# Altium footprint library En.PcbLib: 240 footprints (part 8 of 15)
Each footprint in its own frame and in the unit in brackets; x right, y up, seen from the top. Pads: shape width x height; smd on the part's side, far side on the other; paste and mask are expansions set on the pad; w line width, h text height; cw(c..) or ccw(c..) is an arc to the next point about the centre after c.
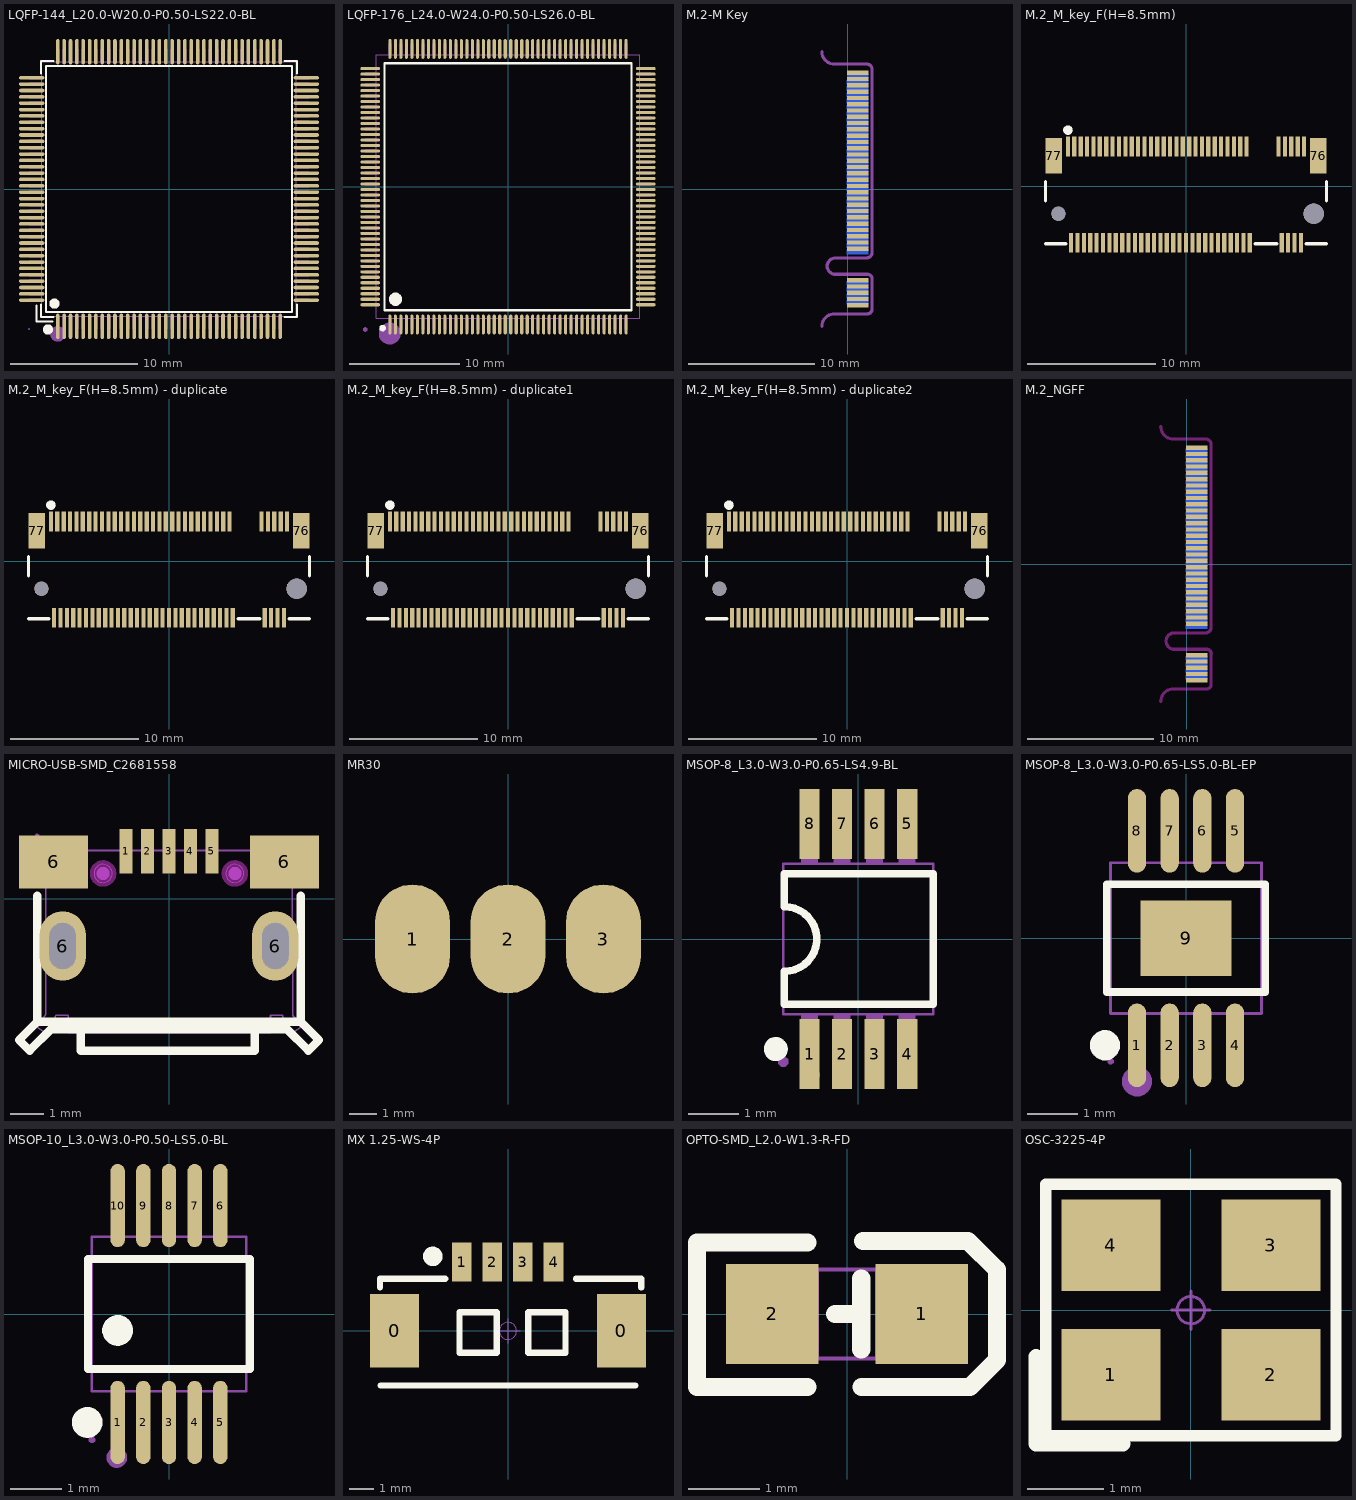
[diagram p7: the footprints below, top view; thin cyan lines are the x and y axes]

## LQFP-144_L20.0-W20.0-P0.50-LS22.0-BL [mm]
pads (144):
  oval 0.28x2 smd: 1(-8.75,-10.8) 2(-8.25,-10.8) 3(-7.75,-10.8) 4(-7.25,-10.8) 5(-6.75,-10.8) 6(-6.25,-10.8) 7(-5.75,-10.8) 8(-5.25,-10.8) 9(-4.75,-10.8) 10(-4.25,-10.8) 11(-3.75,-10.8) 12(-3.25,-10.8) 13(-2.75,-10.8) 14(-2.25,-10.8) 15(-1.75,-10.8) 16(-1.25,-10.8) 17(-0.75,-10.8) 18(-0.25,-10.8) 19(0.25,-10.8) 20(0.75,-10.8) 21(1.25,-10.8) 22(1.75,-10.8) 23(2.25,-10.8) 24(2.75,-10.8) 25(3.25,-10.8) 26(3.75,-10.8) 27(4.25,-10.8) 28(4.75,-10.8) 29(5.25,-10.8) 30(5.75,-10.8) 31(6.25,-10.8) 32(6.75,-10.8) 33(7.25,-10.8) 34(7.75,-10.8) 35(8.25,-10.8) 36(8.75,-10.8) 73(8.75,10.8) 74(8.25,10.8) 75(7.75,10.8) 76(7.25,10.8) 77(6.75,10.8) 78(6.25,10.8) 79(5.75,10.8) 80(5.25,10.8) 81(4.75,10.8) 82(4.25,10.8) 83(3.75,10.8) 84(3.25,10.8) 85(2.75,10.8) 86(2.25,10.8) 87(1.75,10.8) 88(1.25,10.8) 89(0.75,10.8) 90(0.25,10.8) 91(-0.25,10.8) 92(-0.75,10.8) 93(-1.25,10.8) 94(-1.75,10.8) 95(-2.25,10.8) 96(-2.75,10.8) 97(-3.25,10.8) 98(-3.75,10.8) 99(-4.25,10.8) 100(-4.75,10.8) 101(-5.25,10.8) 102(-5.75,10.8) 103(-6.25,10.8) 104(-6.75,10.8) 105(-7.25,10.8) 106(-7.75,10.8) 107(-8.25,10.8) 108(-8.75,10.8)
  oval 2x0.28 smd: 37(10.8,-8.75) 38(10.8,-8.25) 39(10.8,-7.75) 40(10.8,-7.25) 41(10.8,-6.75) 42(10.8,-6.25) 43(10.8,-5.75) 44(10.8,-5.25) 45(10.8,-4.75) 46(10.8,-4.25) 47(10.8,-3.75) 48(10.8,-3.25) 49(10.8,-2.75) 50(10.8,-2.25) 51(10.8,-1.75) 52(10.8,-1.25) 53(10.8,-0.75) 54(10.8,-0.25) 55(10.8,0.25) 56(10.8,0.75) 57(10.8,1.25) 58(10.8,1.75) 59(10.8,2.25) 60(10.8,2.75) 61(10.8,3.25) 62(10.8,3.75) 63(10.8,4.25) 64(10.8,4.75) 65(10.8,5.25) 66(10.8,5.75) 67(10.8,6.25) 68(10.8,6.75) 69(10.8,7.25) 70(10.8,7.75) 71(10.8,8.25) 72(10.8,8.75) 109(-10.8,8.75) 110(-10.8,8.25) 111(-10.8,7.75) 112(-10.8,7.25) 113(-10.8,6.75) 114(-10.8,6.25) 115(-10.8,5.75) 116(-10.8,5.25) 117(-10.8,4.75) 118(-10.8,4.25) 119(-10.8,3.75) 120(-10.8,3.25) 121(-10.8,2.75) 122(-10.8,2.25) 123(-10.8,1.75) 124(-10.8,1.25) 125(-10.8,0.75) 126(-10.8,0.25) 127(-10.8,-0.25) 128(-10.8,-0.75) 129(-10.8,-1.25) 130(-10.8,-1.75) 131(-10.8,-2.25) 132(-10.8,-2.75) 133(-10.8,-3.25) 134(-10.8,-3.75) 135(-10.8,-4.25) 136(-10.8,-4.75) 137(-10.8,-5.25) 138(-10.8,-5.75) 139(-10.8,-6.25) 140(-10.8,-6.75) 141(-10.8,-7.25) 142(-10.8,-7.75) 143(-10.8,-8.25) 144(-10.8,-8.75)
Top Overlay:
  circle w0.4: c-9.017,-9.017 r0.2
  circle w0.4: c-9.525,-11.049 r0.2
  lines w0.152: -10.414,-9.144 -10.414,-10.414 -9.144,-10.414 ; -10.076,-9.081 -10.076,-10.076 -9.08,-10.076 ; -10.076,9.08 -10.076,10.076 -9.08,10.076 ; 9.081,-10.076 10.076,-10.076 10.076,-9.081 ; 9.081,10.076 10.076,10.076 10.076,9.08 ; -9.671,-9.671 9.671,-9.671 9.671,9.671 -9.671,9.671 -9.671,-9.671
Mechanical 6:
  circle w0.6: c-8.75,-11.4 r0.3
Mechanical 15:
  drawing of 293 lines, arcs and shapes, not listed
3D body "User Library-STM32H753ZGT6.SLDPRT": height 1.6, standoff 0, extent -11.075,-11.075 11.075,11.075

## LQFP-176_L24.0-W24.0-P0.50-LS26.0-BL [mm]
pads (176):
  oval 0.28x1.8 smd: 1(-10.75,-12.55) 2(-10.25,-12.55) 3(-9.75,-12.55) 4(-9.25,-12.55) 5(-8.75,-12.55) 6(-8.25,-12.55) 7(-7.75,-12.55) 8(-7.25,-12.55) 9(-6.75,-12.55) 10(-6.25,-12.55) 11(-5.75,-12.55) 12(-5.25,-12.55) 13(-4.75,-12.55) 14(-4.25,-12.55) 15(-3.75,-12.55) 16(-3.25,-12.55) 17(-2.75,-12.55) 18(-2.25,-12.55) 19(-1.75,-12.55) 20(-1.25,-12.55) 21(-0.75,-12.55) 22(-0.25,-12.55) 23(0.25,-12.55) 24(0.75,-12.55) 25(1.25,-12.55) 26(1.75,-12.55) 27(2.25,-12.55) 28(2.75,-12.55) 29(3.25,-12.55) 30(3.75,-12.55) 31(4.25,-12.55) 32(4.75,-12.55) 33(5.25,-12.55) 34(5.75,-12.55) 35(6.25,-12.55) 36(6.75,-12.55) 37(7.25,-12.55) 38(7.75,-12.55) 39(8.25,-12.55) 40(8.75,-12.55) 41(9.25,-12.55) 42(9.75,-12.55) 43(10.25,-12.55) 44(10.75,-12.55) 89(10.75,12.55) 90(10.25,12.55) 91(9.75,12.55) 92(9.25,12.55) 93(8.75,12.55) 94(8.25,12.55) 95(7.75,12.55) 96(7.25,12.55) 97(6.75,12.55) 98(6.25,12.55) 99(5.75,12.55) 100(5.25,12.55) 101(4.75,12.55) 102(4.25,12.55) 103(3.75,12.55) 104(3.25,12.55) 105(2.75,12.55) 106(2.25,12.55) 107(1.75,12.55) 108(1.25,12.55) 109(0.75,12.55) 110(0.25,12.55) 111(-0.25,12.55) 112(-0.75,12.55) 113(-1.25,12.55) 114(-1.75,12.55) 115(-2.25,12.55) 116(-2.75,12.55) 117(-3.25,12.55) 118(-3.75,12.55) 119(-4.25,12.55) 120(-4.75,12.55) 121(-5.25,12.55) 122(-5.75,12.55) 123(-6.25,12.55) 124(-6.75,12.55) 125(-7.25,12.55) 126(-7.75,12.55) 127(-8.25,12.55) 128(-8.75,12.55) 129(-9.25,12.55) 130(-9.75,12.55) 131(-10.25,12.55) 132(-10.75,12.55)
  oval 1.8x0.28 smd: 45(12.55,-10.75) 46(12.55,-10.25) 47(12.55,-9.75) 48(12.55,-9.25) 49(12.55,-8.75) 50(12.55,-8.25) 51(12.55,-7.75) 52(12.55,-7.25) 53(12.55,-6.75) 54(12.55,-6.25) 55(12.55,-5.75) 56(12.55,-5.25) 57(12.55,-4.75) 58(12.55,-4.25) 59(12.55,-3.75) 60(12.55,-3.25) 61(12.55,-2.75) 62(12.55,-2.25) 63(12.55,-1.75) 64(12.55,-1.25) 65(12.55,-0.75) 66(12.55,-0.25) 67(12.55,0.25) 68(12.55,0.75) 69(12.55,1.25) 70(12.55,1.75) 71(12.55,2.25) 72(12.55,2.75) 73(12.55,3.25) 74(12.55,3.75) 75(12.55,4.25) 76(12.55,4.75) 77(12.55,5.25) 78(12.55,5.75) 79(12.55,6.25) 80(12.55,6.75) 81(12.55,7.25) 82(12.55,7.75) 83(12.55,8.25) 84(12.55,8.75) 85(12.55,9.25) 86(12.55,9.75) 87(12.55,10.25) 88(12.55,10.75) 133(-12.55,10.75) 134(-12.55,10.25) 135(-12.55,9.75) 136(-12.55,9.25) 137(-12.55,8.75) 138(-12.55,8.25) 139(-12.55,7.75) 140(-12.55,7.25) 141(-12.55,6.75) 142(-12.55,6.25) 143(-12.55,5.75) 144(-12.55,5.25) 145(-12.55,4.75) 146(-12.55,4.25) 147(-12.55,3.75) 148(-12.55,3.25) 149(-12.55,2.75) 150(-12.55,2.25) 151(-12.55,1.75) 152(-12.55,1.25) 153(-12.55,0.75) 154(-12.55,0.25) 155(-12.55,-0.25) 156(-12.55,-0.75) 157(-12.55,-1.25) 158(-12.55,-1.75) 159(-12.55,-2.25) 160(-12.55,-2.75) 161(-12.55,-3.25) 162(-12.55,-3.75) 163(-12.55,-4.25) 164(-12.55,-4.75) 165(-12.55,-5.25) 166(-12.55,-5.75) 167(-12.55,-6.25) 168(-12.55,-6.75) 169(-12.55,-7.25) 170(-12.55,-7.75) 171(-12.55,-8.25) 172(-12.55,-8.75) 173(-12.55,-9.25) 174(-12.55,-9.75) 175(-12.55,-10.25) 176(-12.55,-10.75)
Top Overlay:
  lines w0.2: -11.25,-11.25 11.25,-11.25 11.25,11.25 -11.25,11.25 -11.25,-11.25
  lines w0.3: -11.425,-12.725 ccw(c-11.424,-12.875) -11.424,-13.025 ccw(c-11.424,-12.875) -11.422,-12.725
  lines w0.6: -10.249,-9.949 ccw(c-10.246,-10.249) -10.246,-10.549 ccw(c-10.246,-10.249) -10.244,-9.949
Mechanical 6:
  circle w1: c-10.77,-13.37 r0.5
Mechanical 15:
  drawing of 357 lines, arcs and shapes, not listed
3D body "stm32h743iit6.step": height 1.46, standoff -0.04, extent -13,-13 13,13

## M.2-M Key [mm]
pads (67):
  rect 1.7x0.34 smd paste+0 mask+0.102: 1(0.787,9.25) 3(0.786,8.75) 5(0.786,8.249) 7(0.786,7.749) 9(0.786,7.249) 11(0.786,6.749) 13(0.786,6.249) 15(0.786,5.749) 17(0.786,5.249) 19(0.786,4.749) 21(0.786,4.249) 23(0.786,3.749) 25(0.786,3.249) 27(0.786,2.749) 29(0.786,2.249) 31(0.786,1.749) 33(0.786,1.249) 35(0.786,0.749) 37(0.786,0.249) 39(0.786,-0.251) 41(0.786,-0.751) 43(0.786,-1.251) 45(0.786,-1.751) 47(0.786,-2.251) 49(0.786,-2.751) 51(0.786,-3.251) 53(0.786,-3.751) 55(0.786,-4.251) 57(0.786,-4.751) 67(0.786,-7.251) 69(0.786,-7.751) 71(0.786,-8.251) 73(0.786,-8.751) 75(0.786,-9.251)
  rect 1.7x0.34 smd far side paste+0 mask+0.102: 2(0.787,9) 4(0.786,8.501) 6(0.786,8.001) 8(0.786,7.501) 10(0.786,7.001) 12(0.786,6.501) 14(0.786,6.001) 16(0.786,5.501) 18(0.786,5.001) 20(0.786,4.499) 22(0.786,4.001) 24(0.786,3.501) 26(0.786,3.001) 28(0.786,2.501) 30(0.786,2.001) 32(0.786,1.501) 34(0.786,1.001) 36(0.786,0.501) 38(0.786,0.001) 40(0.786,-0.499) 42(0.786,-0.998) 44(0.786,-1.499) 46(0.786,-1.999) 48(0.786,-2.499) 50(0.786,-2.999) 52(0.786,-3.499) 54(0.786,-3.999) 56(0.786,-4.499) 58(0.786,-4.999) 68(0.786,-7.499) 70(0.786,-7.999) 72(0.786,-8.499) 74(0.786,-8.999)
Mechanical 1:
  lines w0.254: -2.063,-10.93 cw(c-1.063,-10.93) -1.063,-9.93 1.569,-9.93 ; -2.063,10.93 ccw(c-1.063,10.94) -1.054,9.94 1.525,9.94 ; 1.521,-5.48 -0.963,-5.48 ccw(c-0.974,-6.152) -1.645,-6.142 ccw(c-0.985,-6.12) -0.963,-6.78 1.584,-6.78 cw(c1.57,-7.146) 1.936,-7.16 ; 1.523,-5.478 ccw(c1.511,-5.059) 1.93,-5.046 1.93,9.518 ; 1.549,9.94 cw(c1.523,9.533) 1.93,9.508 ; 1.574,-9.935 ccw(c1.561,-9.569) 1.927,-9.555 1.927,-7.169

## M.2_M_key_F(H=8.5mm) [mm] "PCIe M.2 Connectors, Storage and Server Connector, P=0.5mm, H=8.5mm, Key M"
pads (72):
  rect 0.33x1.55 smd: 1(-9.25,3.14) 2(-9,-4.41) 3(-8.75,3.14) 4(-8.5,-4.41) 5(-8.25,3.14) 6(-8,-4.41) 7(-7.75,3.14) 8(-7.5,-4.41) 9(-7.25,3.14) 10(-7,-4.41) 11(-6.75,3.14) 12(-6.5,-4.41) 13(-6.25,3.14) 14(-6,-4.41) 15(-5.75,3.14) 16(-5.5,-4.41) 17(-5.25,3.14) 18(-5,-4.41) 19(-4.75,3.14) 20(-4.5,-4.41) 21(-4.25,3.14) 22(-4,-4.41) 23(-3.75,3.14) 24(-3.5,-4.41) 25(-3.25,3.14) 26(-3,-4.41) 27(-2.75,3.14) 28(-2.5,-4.41) 29(-2.25,3.14) 30(-2,-4.41) 31(-1.75,3.14) 32(-1.5,-4.41) 33(-1.25,3.14) 34(-1,-4.41) 35(-0.75,3.14) 36(-0.5,-4.41) 37(-0.25,3.14) 38(0,-4.41) 39(0.25,3.14) 40(0.5,-4.41) 41(0.75,3.14) 42(1,-4.41) 43(1.25,3.14) 44(1.5,-4.41) 45(1.75,3.14) 46(2,-4.41) 47(2.25,3.14) 48(2.5,-4.41) 49(2.75,3.14) 50(3,-4.41) 51(3.25,3.14) 52(3.5,-4.41) 53(3.75,3.14) 54(4,-4.41) 55(4.25,3.14) 56(4.5,-4.41) 57(4.75,3.14) 58(5,-4.41) 67(7.25,3.14) 68(7.5,-4.41) 69(7.75,3.14) 70(8,-4.41) 71(8.25,3.14) 72(8.5,-4.41) 73(8.75,3.14) 74(9,-4.41) 75(9.25,3.14)
  rect 1.3x2.8 smd: 76(10.35,2.415) 77(-10.35,2.415)
  round 1.1 hole 1.1 unplated: ""(-10,-2.135)
  round 0.762 on Top Overlay: ""(-9.25,4.41)
  round 1.6 hole 1.6 unplated: ""(10,-2.135)
Top Overlay:
  lines w0.254: -11,-4.485 -9.396,-4.485 ; -11,-1.135 -11,0.365 ; 5.396,-4.485 7.104,-4.485 ; 9.396,-4.485 11,-4.485 ; 11,-1.135 11,0.365
3D body "MDT850M01501--3DModel-STEP-533217.STEP": height 8.48, standoff -0.52, extent -10.95,-4.866 10.95,3.534

## M.2_M_key_F(H=8.5mm) - duplicate [mm] "PCIe M.2 Connectors, Storage and Server Connector, P=0.5mm, H=8.5mm, Key M"
pads (72):
  rect 0.33x1.55 smd: 1(-9.25,3.14) 2(-9,-4.41) 3(-8.75,3.14) 4(-8.5,-4.41) 5(-8.25,3.14) 6(-8,-4.41) 7(-7.75,3.14) 8(-7.5,-4.41) 9(-7.25,3.14) 10(-7,-4.41) 11(-6.75,3.14) 12(-6.5,-4.41) 13(-6.25,3.14) 14(-6,-4.41) 15(-5.75,3.14) 16(-5.5,-4.41) 17(-5.25,3.14) 18(-5,-4.41) 19(-4.75,3.14) 20(-4.5,-4.41) 21(-4.25,3.14) 22(-4,-4.41) 23(-3.75,3.14) 24(-3.5,-4.41) 25(-3.25,3.14) 26(-3,-4.41) 27(-2.75,3.14) 28(-2.5,-4.41) 29(-2.25,3.14) 30(-2,-4.41) 31(-1.75,3.14) 32(-1.5,-4.41) 33(-1.25,3.14) 34(-1,-4.41) 35(-0.75,3.14) 36(-0.5,-4.41) 37(-0.25,3.14) 38(0,-4.41) 39(0.25,3.14) 40(0.5,-4.41) 41(0.75,3.14) 42(1,-4.41) 43(1.25,3.14) 44(1.5,-4.41) 45(1.75,3.14) 46(2,-4.41) 47(2.25,3.14) 48(2.5,-4.41) 49(2.75,3.14) 50(3,-4.41) 51(3.25,3.14) 52(3.5,-4.41) 53(3.75,3.14) 54(4,-4.41) 55(4.25,3.14) 56(4.5,-4.41) 57(4.75,3.14) 58(5,-4.41) 67(7.25,3.14) 68(7.5,-4.41) 69(7.75,3.14) 70(8,-4.41) 71(8.25,3.14) 72(8.5,-4.41) 73(8.75,3.14) 74(9,-4.41) 75(9.25,3.14)
  rect 1.3x2.8 smd: 76(10.35,2.415) 77(-10.35,2.415)
  round 1.1 hole 1.1 unplated: ""(-10,-2.135)
  round 0.762 on Top Overlay: ""(-9.25,4.41)
  round 1.6 hole 1.6 unplated: ""(10,-2.135)
Top Overlay:
  lines w0.254: -11,-4.485 -9.396,-4.485 ; -11,-1.135 -11,0.365 ; 5.396,-4.485 7.104,-4.485 ; 9.396,-4.485 11,-4.485 ; 11,-1.135 11,0.365
3D body "MDT850M01501--3DModel-STEP-533217.STEP": height 8.48, standoff -0.52, extent -10.95,-4.866 10.95,3.534

## M.2_M_key_F(H=8.5mm) - duplicate1 [mm] "PCIe M.2 Connectors, Storage and Server Connector, P=0.5mm, H=8.5mm, Key M"
pads (72):
  rect 0.33x1.55 smd: 1(-9.25,3.14) 2(-9,-4.41) 3(-8.75,3.14) 4(-8.5,-4.41) 5(-8.25,3.14) 6(-8,-4.41) 7(-7.75,3.14) 8(-7.5,-4.41) 9(-7.25,3.14) 10(-7,-4.41) 11(-6.75,3.14) 12(-6.5,-4.41) 13(-6.25,3.14) 14(-6,-4.41) 15(-5.75,3.14) 16(-5.5,-4.41) 17(-5.25,3.14) 18(-5,-4.41) 19(-4.75,3.14) 20(-4.5,-4.41) 21(-4.25,3.14) 22(-4,-4.41) 23(-3.75,3.14) 24(-3.5,-4.41) 25(-3.25,3.14) 26(-3,-4.41) 27(-2.75,3.14) 28(-2.5,-4.41) 29(-2.25,3.14) 30(-2,-4.41) 31(-1.75,3.14) 32(-1.5,-4.41) 33(-1.25,3.14) 34(-1,-4.41) 35(-0.75,3.14) 36(-0.5,-4.41) 37(-0.25,3.14) 38(0,-4.41) 39(0.25,3.14) 40(0.5,-4.41) 41(0.75,3.14) 42(1,-4.41) 43(1.25,3.14) 44(1.5,-4.41) 45(1.75,3.14) 46(2,-4.41) 47(2.25,3.14) 48(2.5,-4.41) 49(2.75,3.14) 50(3,-4.41) 51(3.25,3.14) 52(3.5,-4.41) 53(3.75,3.14) 54(4,-4.41) 55(4.25,3.14) 56(4.5,-4.41) 57(4.75,3.14) 58(5,-4.41) 67(7.25,3.14) 68(7.5,-4.41) 69(7.75,3.14) 70(8,-4.41) 71(8.25,3.14) 72(8.5,-4.41) 73(8.75,3.14) 74(9,-4.41) 75(9.25,3.14)
  rect 1.3x2.8 smd: 76(10.35,2.415) 77(-10.35,2.415)
  round 1.1 hole 1.1 unplated: ""(-10,-2.135)
  round 0.762 on Top Overlay: ""(-9.25,4.41)
  round 1.6 hole 1.6 unplated: ""(10,-2.135)
Top Overlay:
  lines w0.254: -11,-4.485 -9.396,-4.485 ; -11,-1.135 -11,0.365 ; 5.396,-4.485 7.104,-4.485 ; 9.396,-4.485 11,-4.485 ; 11,-1.135 11,0.365
3D body "MDT850M01501--3DModel-STEP-533217.STEP": height 8.48, standoff -0.52, extent -10.95,-4.866 10.95,3.534

## M.2_M_key_F(H=8.5mm) - duplicate2 [mm] "PCIe M.2 Connectors, Storage and Server Connector, P=0.5mm, H=8.5mm, Key M"
pads (72):
  rect 0.33x1.55 smd: 1(-9.25,3.14) 2(-9,-4.41) 3(-8.75,3.14) 4(-8.5,-4.41) 5(-8.25,3.14) 6(-8,-4.41) 7(-7.75,3.14) 8(-7.5,-4.41) 9(-7.25,3.14) 10(-7,-4.41) 11(-6.75,3.14) 12(-6.5,-4.41) 13(-6.25,3.14) 14(-6,-4.41) 15(-5.75,3.14) 16(-5.5,-4.41) 17(-5.25,3.14) 18(-5,-4.41) 19(-4.75,3.14) 20(-4.5,-4.41) 21(-4.25,3.14) 22(-4,-4.41) 23(-3.75,3.14) 24(-3.5,-4.41) 25(-3.25,3.14) 26(-3,-4.41) 27(-2.75,3.14) 28(-2.5,-4.41) 29(-2.25,3.14) 30(-2,-4.41) 31(-1.75,3.14) 32(-1.5,-4.41) 33(-1.25,3.14) 34(-1,-4.41) 35(-0.75,3.14) 36(-0.5,-4.41) 37(-0.25,3.14) 38(0,-4.41) 39(0.25,3.14) 40(0.5,-4.41) 41(0.75,3.14) 42(1,-4.41) 43(1.25,3.14) 44(1.5,-4.41) 45(1.75,3.14) 46(2,-4.41) 47(2.25,3.14) 48(2.5,-4.41) 49(2.75,3.14) 50(3,-4.41) 51(3.25,3.14) 52(3.5,-4.41) 53(3.75,3.14) 54(4,-4.41) 55(4.25,3.14) 56(4.5,-4.41) 57(4.75,3.14) 58(5,-4.41) 67(7.25,3.14) 68(7.5,-4.41) 69(7.75,3.14) 70(8,-4.41) 71(8.25,3.14) 72(8.5,-4.41) 73(8.75,3.14) 74(9,-4.41) 75(9.25,3.14)
  rect 1.3x2.8 smd: 76(10.35,2.415) 77(-10.35,2.415)
  round 1.1 hole 1.1 unplated: ""(-10,-2.135)
  round 0.762 on Top Overlay: ""(-9.25,4.41)
  round 1.6 hole 1.6 unplated: ""(10,-2.135)
Top Overlay:
  lines w0.254: -11,-4.485 -9.396,-4.485 ; -11,-1.135 -11,0.365 ; 5.396,-4.485 7.104,-4.485 ; 9.396,-4.485 11,-4.485 ; 11,-1.135 11,0.365
3D body "MDT850M01501--3DModel-STEP-533217.STEP": height 8.48, standoff -0.52, extent -10.95,-4.866 10.95,3.534

## M.2_NGFF [mm]
pads (67):
  rect 1.7x0.34 smd paste+0 mask+0.102: 1(0.787,9.25) 3(0.786,8.75) 5(0.786,8.249) 7(0.786,7.749) 9(0.786,7.249) 11(0.786,6.749) 13(0.786,6.249) 15(0.786,5.749) 17(0.786,5.249) 19(0.786,4.749) 21(0.786,4.249) 23(0.786,3.749) 25(0.786,3.249) 27(0.786,2.749) 29(0.786,2.249) 31(0.786,1.749) 33(0.786,1.249) 35(0.786,0.749) 37(0.786,0.249) 39(0.786,-0.251) 41(0.786,-0.751) 43(0.786,-1.251) 45(0.786,-1.751) 47(0.786,-2.251) 49(0.786,-2.751) 51(0.786,-3.251) 53(0.786,-3.751) 55(0.786,-4.251) 57(0.786,-4.751) 67(0.786,-7.251) 69(0.786,-7.751) 71(0.786,-8.251) 73(0.786,-8.751) 75(0.786,-9.251)
  rect 1.7x0.34 smd far side paste+0 mask+0.102: 2(0.787,9) 4(0.786,8.501) 6(0.786,8.001) 8(0.786,7.501) 10(0.786,7.001) 12(0.786,6.501) 14(0.786,6.001) 16(0.786,5.501) 18(0.786,5.001) 20(0.786,4.499) 22(0.786,4.001) 24(0.786,3.501) 26(0.786,3.001) 28(0.786,2.501) 30(0.786,2.001) 32(0.786,1.501) 34(0.786,1.001) 36(0.786,0.501) 38(0.786,0.001) 40(0.786,-0.499) 42(0.786,-0.998) 44(0.786,-1.499) 46(0.786,-1.999) 48(0.786,-2.499) 50(0.786,-2.999) 52(0.786,-3.499) 54(0.786,-3.999) 56(0.786,-4.499) 58(0.786,-4.999) 68(0.786,-7.499) 70(0.786,-7.999) 72(0.786,-8.499) 74(0.786,-8.999)
Keep-Out Layer:
  lines w0.254: -2.063,-10.93 cw(c-1.063,-10.93) -1.063,-9.93 1.574,-9.935 ccw(c1.589,-9.595) 1.927,-9.555 ; -2.063,10.93 ccw(c-1.063,10.93) -1.063,9.93 1.549,9.94 ; 1.523,9.94 cw(c1.502,9.513) 1.93,9.508 ; 1.584,-6.78 cw(c1.598,-7.12) 1.936,-7.16 1.93,-9.567 ; 1.599,-6.773 -0.963,-6.78 cw(c-0.995,-6.13) -0.963,-5.48 1.523,-5.478 ccw(c1.502,-5.051) 1.93,-5.046 1.93,9.559

## MICRO-USB-SMD_C2681558 [mm]
pads (9):
  rect 0.4x1.35 smd paste-100 mask+0.051: 1(-1.3,1.438) 2(-0.65,1.438) 3(0,1.438) 4(0.65,1.438) 5(1.3,1.438)
  rect 2.1x1.6 smd paste-100 mask+0.051: 6(-3.5,1.113) 6(3.5,1.113)
  oval 1.4x2.1 hole 0.8 slot 1.4 at 90 deg: 6(-3.225,-1.438) 6(3.225,-1.438)
Top Overlay:
  lines w0.254: -4,0.081 -4,-3.737 ; -2.675,-3.962 -2.675,-4.612 2.6,-4.612 2.6,-3.962 ; 4,0.081 4,-3.737 ; -4,-3.737 -4.55,-4.287 -4.225,-4.612 -3.575,-3.962 3.575,-3.962 4.225,-4.612 4.55,-4.287 4,-3.737 ; -4,-3.737 4,-3.737
Top Paste:
  drawing of 9 lines, arcs and shapes, not listed
Keep-Out Layer:
  board cut-out: -1.725,0.763 -1.725,0.817 -1.768,0.917 -1.845,0.994 -1.945,1.036 -2.054,1.036 -2.155,0.994 -2.232,0.918 -2.275,0.817 -2.275,0.763 -2.275,0.708 -2.232,0.608 -2.155,0.531 -2.055,0.49 -1.946,0.489 -1.845,0.531 -1.768,0.608 -1.725,0.708
  board cut-out: 2.275,0.763 2.275,0.817 2.232,0.917 2.155,0.994 2.055,1.036 1.946,1.036 1.845,0.994 1.768,0.918 1.725,0.817 1.725,0.763 1.725,0.708 1.768,0.608 1.845,0.531 1.945,0.49 2.054,0.489 2.155,0.531 2.232,0.608 2.275,0.708
Mechanical 1:
  circle w0.025: c-2,0.763 r0.275
  circle w0.025: c2,0.763 r0.275
Mechanical 6:
  circle w0.2: c-2,0.763 r0.1
  circle w0.2: c2,0.763 r0.1
Mechanical 15:
  region: -3.94,1.913 -3.94,1.937 -3.975,1.973 -4.025,1.973 -4.06,1.937 -4.06,1.913 -4.06,1.888 -4.025,1.853 -3.975,1.853 -3.94,1.888
  region: 1.175,1.913 1.425,1.913 1.425,0.963 1.175,0.963
  region: 0.525,1.913 0.775,1.913 0.775,0.963 0.525,0.963
  region: -0.125,1.913 0.125,1.913 0.125,0.963 -0.125,0.963
  region: -0.775,1.913 -0.525,1.913 -0.525,0.963 -0.775,0.963
  region: -1.425,1.913 -1.175,1.913 -1.175,0.963 -1.425,0.963
  region: 2.74,1.46 3.74,1.46 3.74,0.51 2.74,0.51
  region: -3.75,1.46 -2.75,1.46 -2.75,0.51 -3.75,0.51
  region: 3.45,-0.988 3.45,-1.888 3,-1.888 3,-0.988
  region: -3,-0.988 -3,-1.888 -3.45,-1.888 -3.45,-0.988
  lines w0.051: -4,-3.9 -3.75,-4.07 -3.48,-3.68 -3.44,-3.54 -3.06,-3.54 -3.06,-4.06 3.08,-4.06 3.08,-3.54 3.45,-3.54 3.47,-3.67 3.58,-3.82 3.75,-4.07 4,-3.9 3.75,-3.54 3.74,1.46 -3.74,1.46 -3.74,-3.52 -4,-3.9
Multi-Layer keep-out:
  circle w0.254: c-2,0.763 r0.275
  circle w0.254: c2,0.763 r0.275
3D body "micro 6.4jb.step": height 2.72, standoff -1.21, extent -4,-4.118 4,1.862

## MR30 [mm]
pads (3):
  oval 2.75x4 smd: 1(-3.5,0) 2(0,0) 3(3.5,0)
3D body "mr30-m.step": height 2.45, standoff -2.46, extent -5.95,-0.36 5.95,13.04

## MSOP-8_L3.0-W3.0-P0.65-LS4.9-BL [mil]
pads (8):
  rect 15.98x55 smd: 1(-38.39,-90.55) 2(-12.8,-90.55) 3(12.8,-90.55) 4(38.39,-90.55) 5(38.39,90.55) 6(12.8,90.55) 7(-12.8,90.55) 8(-38.39,90.55)
Top Overlay:
  circle w9.45: c-64.96,-86.61 r4.72
  lines w5.91: -58.2,-51.18 -58.2,-25.5 ccw(c-58.2,0) -58.2,25.5 -58.2,51.18 59.05,51.18 59.05,-51.18 -58.2,-51.18
Mechanical 6:
  circle w7.87: c-38.19,-107.09 r3.94
Mechanical 15:
  region: -55.11,-96.46 -55.11,-94.83 -57.42,-92.52 -60.68,-92.52 -62.99,-94.83 -62.99,-96.46 -62.99,-98.09 -60.68,-100.4 -57.42,-100.4 -55.11,-98.09
  region: 6.4,-71 19.19,-71 19.19,-96.46 6.4,-96.46
  region: 6.42,-58.66 6.42,-72.44 19.17,-72.44 19.17,-58.66
  region: 31.99,-71 44.78,-71 44.78,-96.46 31.99,-96.46
  region: 32.01,-58.66 32.01,-72.44 44.77,-72.44 44.77,-58.66
  region: -19.19,-71 -6.4,-71 -6.4,-96.46 -19.19,-96.46
  region: -19.17,-58.66 -19.17,-72.44 -6.42,-72.44 -6.42,-58.66
  region: -44.78,-71 -31.99,-71 -31.99,-96.46 -44.78,-96.46
  region: -44.76,-58.66 -44.76,-72.44 -32.01,-72.44 -32.01,-58.66
  region: 19.19,71 6.4,71 6.4,96.46 19.19,96.46
  region: 19.18,58.66 19.18,72.44 6.42,72.44 6.42,58.66
  region: 44.78,71 31.99,71 31.99,96.46 44.78,96.46
  region: 44.77,58.66 44.77,72.44 32.01,72.44 32.01,58.66
  region: -6.4,71 -19.2,71 -19.2,96.46 -6.4,96.46
  region: -6.42,58.66 -6.42,72.44 -19.17,72.44 -19.17,58.66
  region: -31.99,71 -44.78,71 -44.78,96.46 -31.99,96.46
  region: -32.01,58.66 -32.01,72.44 -44.76,72.44 -44.76,58.66
  lines w2: -59.05,-59.05 59.05,-59.05 59.05,59.05 -59.05,59.05 -59.05,-59.05
3D body "User Library-MSOP8.SLDPRT": height 42, standoff -1.31, extent -61.02,-97.2 61.02,97.2

## MSOP-8_L3.0-W3.0-P0.65-LS5.0-BL-EP [mm]
pads (9):
  oval 0.364x1.662 smd: 1(-0.975,-2.131) 2(-0.325,-2.131) 3(0.325,-2.131) 4(0.975,-2.131) 5(0.975,2.131) 6(0.325,2.131) 7(-0.325,2.131) 8(-0.975,2.131)
  rect 1.8x1.5 smd: 9(0,0)
Top Overlay:
  circle w0.3: c-1.609,-2.131 r0.15
  lines w0.152: -1.576,-1.071 1.576,-1.071 1.576,1.071 -1.576,1.071 -1.576,-1.071
Mechanical 6:
  circle w0.3: c-0.975,-2.85 r0.15
Mechanical 15:
  region: -0.88,0.712 0.88,0.712 0.88,-0.712 -0.88,-0.712
  region: 0.817,1.91 0.817,1.49 1.133,1.49 1.133,1.91
  region: 0.817,2.45 0.817,1.9 1.133,1.9 1.133,2.45
  region: 0.167,1.91 0.167,1.49 0.482,1.49 0.482,1.91
  region: 0.167,2.45 0.167,1.9 0.482,1.9 0.482,2.45
  region: -0.482,1.91 -0.482,1.49 -0.167,1.49 -0.167,1.91
  region: -0.482,2.45 -0.482,1.9 -0.167,1.9 -0.167,2.45
  region: -1.133,1.91 -1.133,1.49 -0.817,1.49 -0.817,1.91
  region: -1.133,2.45 -1.133,1.9 -0.817,1.9 -0.817,2.45
  region: 0.817,-1.91 0.817,-1.49 1.133,-1.49 1.133,-1.91
  region: 0.817,-2.45 0.817,-1.9 1.133,-1.9 1.133,-2.45
  region: 0.167,-1.91 0.167,-1.49 0.482,-1.49 0.482,-1.91
  region: 0.167,-2.45 0.167,-1.9 0.482,-1.9 0.482,-2.45
  region: -0.482,-1.91 -0.482,-1.49 -0.167,-1.49 -0.167,-1.91
  region: -0.482,-2.45 -0.482,-1.9 -0.167,-1.9 -0.167,-2.45
  region: -1.133,-1.91 -1.133,-1.49 -0.817,-1.49 -0.817,-1.91
  region: -1.133,-2.45 -1.133,-1.9 -0.817,-1.9 -0.817,-2.45
  region: -1.44,-2.45 -1.44,-2.426 -1.475,-2.391 -1.524,-2.391 -1.559,-2.426 -1.56,-2.45 -1.559,-2.475 -1.524,-2.509 -1.475,-2.509 -1.44,-2.475
  lines w0.051: -1.5,-1.5 1.5,-1.5 1.5,1.5 -1.5,1.5 -1.5,-1.5
3D body "ltc4444ems8e#pbf.step": height 1.1, standoff 0, extent -1.5,-2.45 1.5,2.45

## MSOP-10_L3.0-W3.0-P0.50-LS5.0-BL [mm]
pads (10):
  oval 0.28x1.62 smd: 1(-1,-2.11) 2(-0.5,-2.11) 3(0,-2.11) 4(0.5,-2.11) 5(1,-2.11) 6(1,2.11) 7(0.5,2.11) 8(0,2.11) 9(-0.5,2.11) 10(-1,2.11)
Top Overlay:
  circle w0.3: c-1,-0.319 r0.15
  circle w0.3: c-1.592,-2.11 r0.15
  lines w0.152: -1.576,-1.071 -1.576,1.071 1.576,1.071 1.576,-1.071 -1.576,-1.071
Mechanical 6:
  circle w0.2: c-1.016,-2.794 r0.1
Mechanical 15:
  region: -1.44,-2.45 -1.44,-2.426 -1.475,-2.391 -1.524,-2.391 -1.559,-2.426 -1.56,-2.45 -1.559,-2.475 -1.524,-2.509 -1.475,-2.509 -1.44,-2.475
  region: -1.112,-2.45 -1.112,-1.9 -0.888,-1.9 -0.888,-2.45
  region: -1.112,-1.91 -1.112,-1.49 -0.888,-1.49 -0.888,-1.91
  region: -0.612,-2.45 -0.612,-1.9 -0.388,-1.9 -0.388,-2.45
  region: -0.612,-1.91 -0.612,-1.49 -0.388,-1.49 -0.388,-1.91
  region: -0.112,-2.45 -0.112,-1.9 0.112,-1.9 0.112,-2.45
  region: -0.112,-1.91 -0.112,-1.49 0.112,-1.49 0.112,-1.91
  region: 0.388,-2.45 0.388,-1.9 0.612,-1.9 0.612,-2.45
  region: 0.388,-1.91 0.388,-1.49 0.612,-1.49 0.612,-1.91
  region: 0.888,-2.45 0.888,-1.9 1.112,-1.9 1.112,-2.45
  region: 0.888,-1.91 0.888,-1.49 1.112,-1.49 1.112,-1.91
  region: -1.112,2.45 -1.112,1.9 -0.888,1.9 -0.888,2.45
  region: -1.112,1.91 -1.112,1.49 -0.888,1.49 -0.888,1.91
  region: -0.612,2.45 -0.612,1.9 -0.388,1.9 -0.388,2.45
  region: -0.612,1.91 -0.612,1.49 -0.388,1.49 -0.388,1.91
  region: -0.112,2.45 -0.112,1.9 0.112,1.9 0.112,2.45
  region: -0.112,1.91 -0.112,1.49 0.112,1.49 0.112,1.91
  region: 0.388,2.45 0.388,1.9 0.612,1.9 0.612,2.45
  region: 0.388,1.91 0.388,1.49 0.612,1.49 0.612,1.91
  region: 0.888,2.45 0.888,1.9 1.112,1.9 1.112,2.45
  region: 0.888,1.91 0.888,1.49 1.112,1.49 1.112,1.91
  lines w0.051: -1.5,-1.5 -1.5,1.5 1.5,1.5 1.5,-1.5 -1.5,-1.5
3D body "User Library-msop-10.SLDPRT": height 1.15, standoff 0, extent -1.5,-2.45 1.5,2.45

## MX 1.25-WS-4P [mm] "长：10.15mm，宽：4.2mm，高：3.4mm"
height 9.4
pads (6):
  rect 2x3 smd: 0(-4.632,0) 0(4.632,0)
  rect 0.8x1.6 smd: 1(-1.889,2.811) 2(-0.639,2.811) 3(0.611,2.811) 4(1.861,2.811)
Top Overlay:
  circle w0.4: c-3.074,3.048 r0.2
  lines w0.254: -5.233,1.778 -5.233,2.134 -2.566,2.134 ; -5.206,-2.228 5.201,-2.228 ; 2.782,2.134 5.449,2.134 5.449,1.778 ; -1.982,-0.889 -0.458,-0.889 -0.458,0.762 -1.982,0.762 -1.982,-0.889 ; 0.826,-0.889 2.35,-0.889 2.35,0.762 0.826,0.762 0.826,-0.889
Mechanical 15:
  circle w0.05: c0,0 r0.35
  lines w0.05: -0.5,0 0.5,0 ; 0,-0.5 0,0.5
3D body "MOLEX1.25-WS-4P.STEP": height 3.4, standoff 0, extent -5.075,-2.1 5.075,3.09

## OPTO-SMD_L2.0-W1.3-R-FD [mm]
pads (2):
  rect 1.3x1.4 smd: 1(1.05,0) 2(-1.05,0)
Top Overlay:
  lines w0.254: -0.559,-1.029 -2.108,-1.029 -2.108,1.003 -0.559,1.003 ; -0.169,0 0.1,0 ; 0.2,-0.5 0.2,0.5 ; 0.203,-1.029 1.727,-1.029 2.108,-0.648 2.108,0.622 1.702,1.029 0.229,1.029
Mechanical 6:
  region: -1.625,0.652 -0.965,0.652 -0.965,0.412 -1.265,0.412
  region: -1.685,-0.608 -1.025,-0.608 -1.025,-0.368 -1.325,-0.368
  region: 1.135,0.388 0.715,0.388 0.715,-0.392 1.135,-0.392 1.135,-0.272 0.835,-0.272 0.835,-0.032 1.135,-0.032 1.135,0.088 0.835,0.088 0.835,0.268 1.135,0.268
  region: -0.446,0.126 -0.446,0.253 -0.573,0.38 -0.827,0.38 -0.954,0.253 -0.954,-0.255 -0.827,-0.382 -0.573,-0.382 -0.446,-0.255 -0.446,-0.128 -0.573,-0.128 -0.573,-0.255 -0.827,-0.255 -0.827,0.253 -0.573,0.253 -0.573,0.126
Mechanical 15:
  region: -0.4,-0.625 -1,-0.625 -1,0.625 -0.4,0.625
  region: 1,-0.625 0.4,-0.625 0.4,0.625 1,0.625
  region: 1.06,0.625 1.059,0.649 1.024,0.683 0.976,0.683 0.941,0.649 0.94,0.625 0.941,0.601 0.976,0.568 1.024,0.568 1.059,0.601
  lines w0.051: -1,-0.625 -1,0.625 1,0.625 1,-0.625 -1,-0.625
3D body "pt17-21c_l41_tr8.step": height 1, standoff -0.05, extent -1.127,-0.626 0.873,0.625

## OSC-3225-4P [mm] "3.2*2.5*0.7mm(长宽高)                             淘宝ID:黄晶宝石"
pads (4):
  rect 1.3x1.2 smd: 1(-1.05,-0.85) 2(1.05,-0.85) 3(1.05,0.85) 4(-1.05,0.85)
Top Overlay:
  lines w0.15: -1.905,-1.651 1.905,-1.651 1.905,1.651 -1.905,1.651 -1.905,-1.651
  lines w0.2: -2.032,-1.753 -0.889,-1.753 ; -2.032,-1.727 -2.032,-0.61
Mechanical 15:
  circle w0.04: c0,0 r0.18
  lines w0.04: -0.254,0 0.254,0 ; 0,-0.254 0,0.254
3D body "OSC_3225-4.STEP": height 0.7, standoff -0.02, extent -1.6,-1.25 1.6,1.25